# Altium footprint library alex_footprint.PcbLib: 262 footprints (part 12 of 17)
Each footprint in its own frame and in the unit in brackets; x right, y up, seen from the top. Pads: shape width x height; smd on the part's side, far side on the other; paste and mask are expansions set on the pad; w line width, h text height; cw(c..) or ccw(c..) is an arc to the next point about the centre after c.
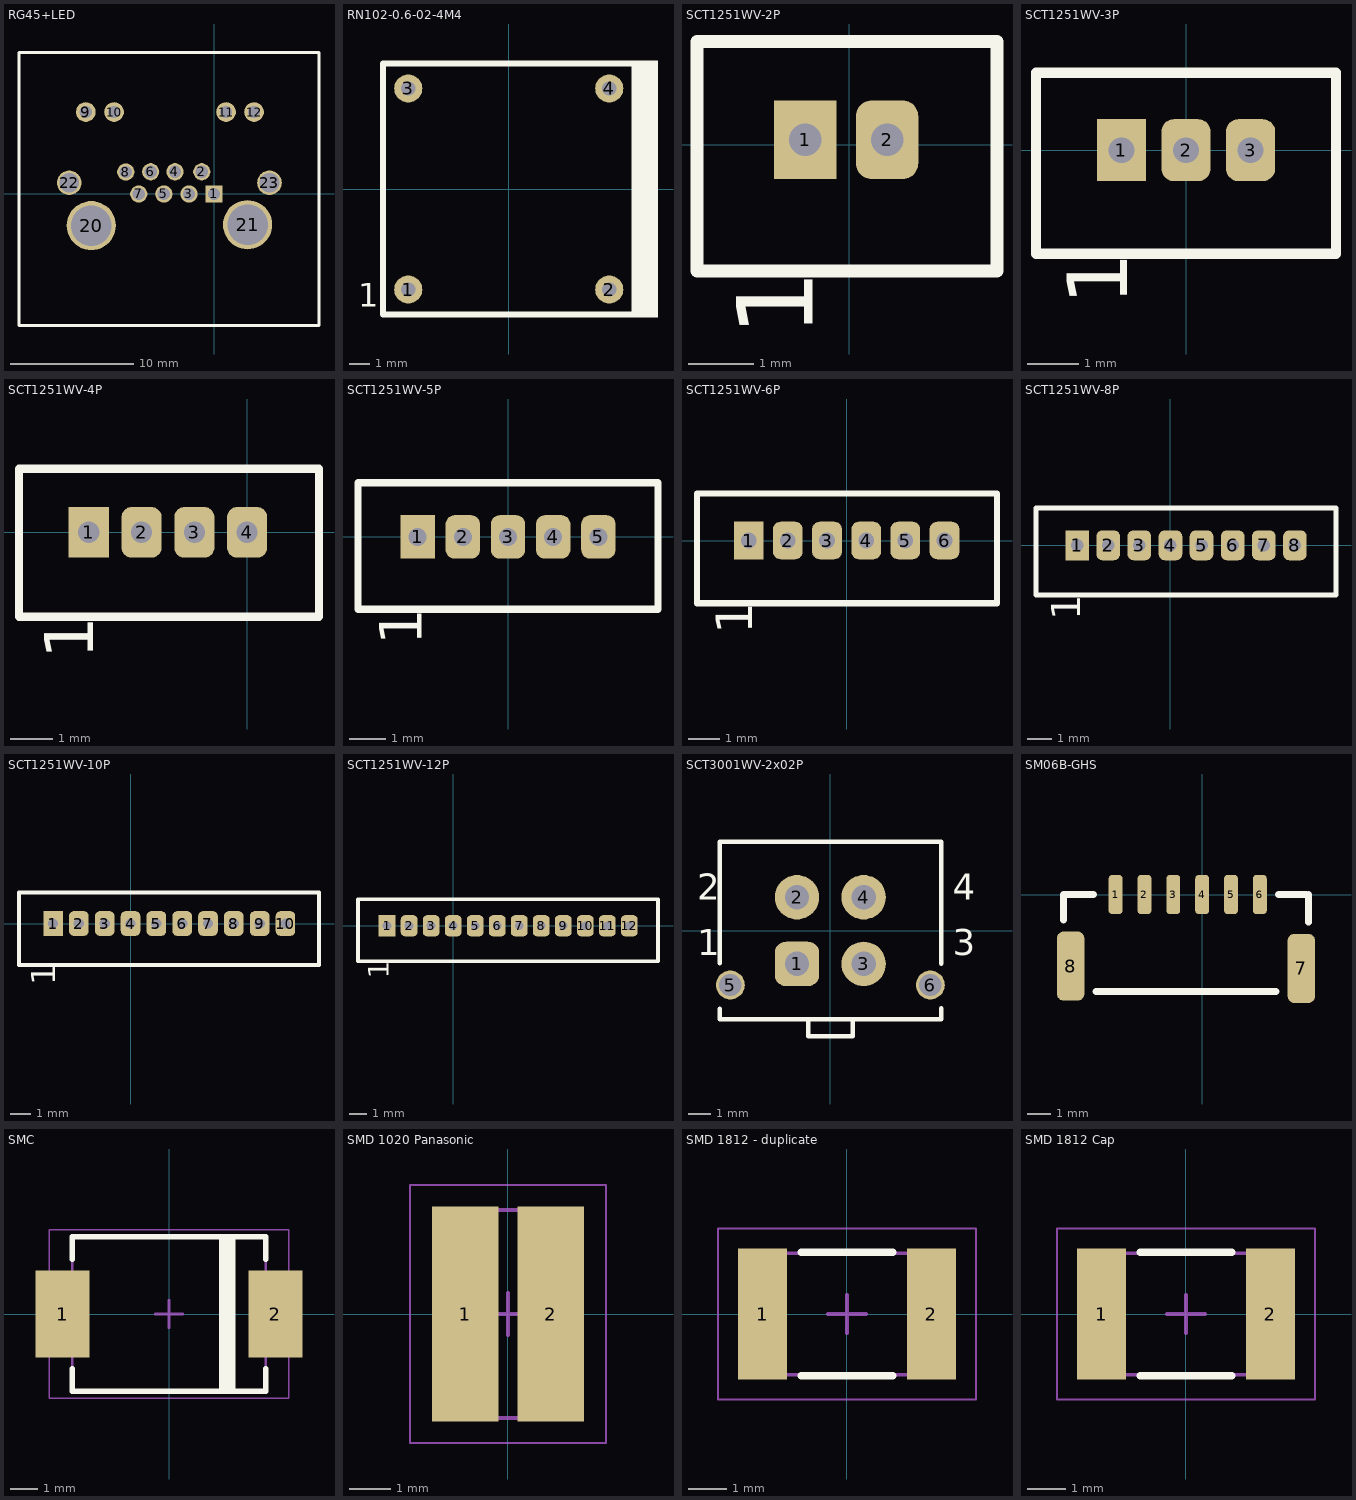
[diagram p11: the footprints below, top view; thin cyan lines are the x and y axes]

## RG45+LED [mm]
height 20
pads (16):
  rect 1.4x1.4 hole 1 unplated: 1(0,0)
  round 1.4 hole 1 unplated: 2(-1,1.8) 3(-2.04,0) 4(-3.177,1.8) 5(-4.08,0) 6(-5.15,1.8) 7(-6.12,0) 8(-7.175,1.775)
  round 1.6 hole 1 unplated: 9(-10.425,6.65) 10(-8.125,6.65) 11(0.975,6.65) 12(3.25,6.65)
  round 4 hole 3.3 unplated: 20(-9.975,-2.575) 21(2.725,-2.5)
  round 2 hole 1.6 unplated: 22(-11.775,0.9) 23(4.5,0.9)
Top Overlay:
  lines w0.254: -15.85,-10.7 -15.85,11.5 8.525,11.5 8.525,-10.7 -15.8,-10.7 -15.85,-10.65

## RN102-0.6-02-4M4 [mm]
pads (4):
  round 1.4 hole 0.7 unplated mask+0.2: 1(-5,-5) 2(5,-5) 3(-5,5) 4(5,5)
Top Overlay:
  rectangle: 6.25,-6.4 7.425,6.4
  lines w0.3: -6.25,-6.25 -6.25,6.25 6.25,6.25 6.25,-6.25 -6.25,-6.25
  text "1" at -7.5,-6.25 h2

## SCT1251WV-2P [mm]
pads (2):
  rect 0.95x1.2 hole 0.5 unplated mask+0.25: 1(-0.675,0.075)
  rrect50% 0.95x1.2 hole 0.5 unplated mask+0.25: 2(0.575,0.075)
Top Overlay:
  lines w0.2: -2.325,-1.925 2.25,-1.925 2.25,-1.05 2.25,0.7 2.25,1.575 -2.325,1.575 -2.325,-1.925
  text "1" at -0.175,-2.925 h2
3D body "530470210.stp": height 4.2, standoff -2.3, extent -2.15,-1.925 2.1,1.275

## SCT1251WV-3P [mm]
pads (3):
  rect 0.95x1.2 hole 0.5 unplated mask+0.25: 1(-1.25,0)
  rrect50% 0.95x1.2 hole 0.5 unplated mask+0.25: 2(0,0) 3(1.25,0)
Top Overlay:
  lines w0.2: -2.9,-2 -2.9,1.5 2.9,1.5 2.9,-2 -2.9,-2
  text "1" at -0.75,-3 h2
3D body "530470310.stp": height 4.2, standoff -2.3, extent -2.775,-2.025 2.725,1.175

## SCT1251WV-4P [mm]
pads (4):
  rect 0.95x1.2 hole 0.5 unplated mask+0.25: 1(-3.75,0)
  rrect50% 0.95x1.2 hole 0.5 unplated mask+0.25: 2(-2.5,0) 3(-1.25,0) 4(0,0)
Top Overlay:
  lines w0.2: -5.4,-2 1,-2 1.7,-2 1.7,1.5 -5.4,1.5 -5.4,-2
  text "1" at -3.25,-3 h2

## SCT1251WV-5P [mm]
pads (5):
  rect 0.95x1.2 hole 0.5 unplated mask+0.25: 1(-2.5,0)
  rrect50% 0.95x1.2 hole 0.5 unplated mask+0.25: 2(-1.25,0) 3(0,0) 4(1.25,0) 5(2.5,0)
Top Overlay:
  lines w0.2: -4.15,-2 -4.15,1.5 4.15,1.5 4.15,-2 2.25,-2 -4.15,-2
  text "1" at -2,-3 h2
3D body "530470510.stp": height 4.2, standoff -2.3, extent -4,-2.075 4,1.125

## SCT1251WV-6P [mm]
pads (6):
  rect 0.95x1.2 hole 0.5 unplated mask+0.25: 1(-3.125,0)
  rrect50% 0.95x1.2 hole 0.5 unplated mask+0.25: 2(-1.875,0) 3(-0.625,0) 4(0.625,0) 5(1.875,0) 6(3.125,0)
Top Overlay:
  lines w0.2: -4.775,-2 -4.775,1.5 4.8,1.5 4.8,-2 1.625,-2 -4.775,-2
  text "1" at -2.625,-3 h2
3D body "530470610.stp": height 4.22, standoff -2.28, extent -4.625,-2.05 4.625,1.15

## SCT1251WV-8P [mm]
pads (8):
  rect 0.95x1.2 hole 0.5 unplated mask+0.25: 1(-3.75,0)
  rrect50% 0.95x1.2 hole 0.5 unplated mask+0.25: 2(-2.5,0) 3(-1.25,0) 4(0,0) 5(1.25,0) 6(2.5,0) 7(3.75,0) 8(5,0)
Top Overlay:
  lines w0.2: 6.65,1.475 6.65,-2 1,-2 -5.4,-2 -5.4,1.5 6.65,1.5
  text "1" at -3.25,-3 h2
3D body "530470810.stp": height 4, standoff -2.5, extent -5.25,-2.025 6.5,1.175

## SCT1251WV-10P [mm]
pads (10):
  rect 0.95x1.2 hole 0.5 unplated mask+0.25: 1(-3.75,0)
  rrect50% 0.95x1.2 hole 0.5 unplated mask+0.25: 2(-2.5,0) 3(-1.25,0) 4(0,0) 5(1.25,0) 6(2.5,0) 7(3.75,0) 8(5,0) 9(6.25,0) 10(7.5,0)
Top Overlay:
  lines w0.2: -5.4,-2 -5.4,1.5 9.125,1.5 9.125,-2 1,-2 -5.4,-2
  text "1" at -3.25,-3 h2
3D body "530471010.stp": height 4.1, standoff -2.4, extent -5.285,-2 8.965,1.2

## SCT1251WV-12P [mm]
pads (12):
  rect 0.95x1.2 hole 0.5 unplated mask+0.25: 1(-3.75,0)
  rrect50% 0.95x1.2 hole 0.5 unplated mask+0.25: 2(-2.5,0) 3(-1.25,0) 4(0,0) 5(1.25,0) 6(2.5,0) 7(3.75,0) 8(5,0) 9(6.25,0) 10(7.5,0) 11(8.75,0) 12(10,0)
Top Overlay:
  lines w0.2: -5.4,-2 -5.4,1.5 9.125,1.5 11.625,1.5 11.625,-2 9.125,-2 1,-2 -5.4,-2
  text "1" at -3.25,-3 h2
3D body "530471210.stp": height 4.05, standoff -2.45, extent -5.245,-2.07 11.505,1.13

## SCT3001WV-2x02P [mm]
pads (6):
  rrect50% 2x2 hole 1.1 unplated mask+0.25: 1(-1.5,-1.5)
  round 2 hole 1.1 unplated mask+0.25: 2(-1.5,1.5) 3(1.5,-1.5) 4(1.5,1.5)
  round 1.3 hole 1 unplated mask+0.25: 5(-4.5,-2.45) 6(4.5,-2.45)
Top Overlay:
  lines w0.2: -4.976,-3.524 -4.976,-4 5,-4 5,-3.5 ; -4.976,-1.476 -4.976,-0.976 -4.976,3.992 4.992,3.992 ; -1,-4 -1,-4.75 0,-4.75 1,-4.75 1,-4 ; 4.992,-1.492 4.992,3.992 ; 5,3.984 4.992,3.992
  text "4" at 5.5,1 h2
  text "3" at 5.5,-1.5 h2
  text "2" at -6,1 h2
  text "1" at -6,-1.5 h2

## SM06B-GHS [mm]
pads (8):
  rrect50% 0.6x1.7 smd mask+0.25: 1(-3.75,0) 2(-2.5,0) 3(-1.25,0) 4(0,0) 5(1.25,0) 6(2.5,0)
  rrect50% 1.2x3 smd mask+0.25: 7(4.3,-3.2) 8(-5.7,-3.1)
Top Overlay:
  lines w0.3: -6,-1.1 -6,0 -4.7,0 ; -4.6,-4.2 3.2,-4.2 ; 3.3,0 4.5,0 ; 4.6,-1.2 4.6,-0.9 4.6,-0.3 4.6,0

## SMC [mm] "Molded Capacitor, 2-Leads, Body 7,00x5,60mm, IPC Medium Density"
height 2.62
pads (2):
  rect 1.95x3.15 smd: 1(-3.85,0) 2(3.85,0)
Top Overlay:
  rectangle: 1.9,-2.8 2.3,2.8
  lines w0.2: -3.5,-1.975 -3.5,-2.8 3.5,-2.8 3.5,-1.975 ; -3.5,1.975 -3.5,2.8 3.5,2.8 3.5,1.975 ; 1.9,-2.5 1.9,-1.9 1.9,2.7 ; 1.9,-2 2,-1.9 2,2.6 1.9,2.7 ; 1.9,-2 1.9,-2.8 1.9,2.7 ; 1.9,-2 2.15,-1.75 2.15,1.05 2.3,1.2 2.3,-2.7 ; 1.9,2.7 2.1,2.7 2.1,-2.8 2.2,-2.7 2.2,2.8 2.3,2.7 ; 2.3,-2.7 2.3,2.7 ; 2.3,-2.7 2.3,2.7
Mechanical 13:
  lines w0.1: -3.5,-2.8 -3.5,2.8 3.5,2.8 3.5,-2.8 -3.5,-2.8
Mechanical 15:
  lines w0.05: -4.325,-3.05 -4.325,3.05 4.325,3.05 4.325,-3.05 -4.325,-3.05
  lines w0.1: -0.5,0 0.5,0 ; 0,-0.5 0,0.5
3D body: height 2.62, standoff 0, extent -3.5,-2.8 3.5,2.8

## SMD 1020 Panasonic [mm]
height 0.6
pads (2):
  rect 1.6x5.15 smd: 1(-1.025,0) 2(1.025,0)
Mechanical 13:
  lines w0.1: -1.25,-2.5 1.25,-2.5 1.25,2.5 -1.25,2.5 -1.25,-2.5
Mechanical 15:
  lines w0.05: -2.35,-3.1 2.35,-3.1 2.35,3.1 -2.35,3.1 -2.35,-3.1
  lines w0.1: -0.5,0 0.5,0 ; 0,-0.5 0,0.5
3D body: height 0.6, standoff 0, extent 0.25,-2.5 1.25,2.5
3D body: height 0.6, standoff 0, extent -1.25,-2.5 -0.25,2.5
3D body: height 0.6, standoff 0, extent -0.25,-2.5 0.25,2.5

## SMD 1812 - duplicate [mm]
height 1.7
pads (2):
  rect 1.3x3.45 smd: 1(-2.225,0) 2(2.225,0)
Top Overlay:
  lines w0.2: -1.2,-1.625 1.2,-1.625 ; -1.2,1.625 1.2,1.625
Mechanical 13:
  lines w0.1: -2.25,-1.6 -2.25,1.6 2.25,1.6 2.25,-1.6 -2.25,-1.6
Mechanical 15:
  lines w0.05: -3.4,-2.25 -3.4,2.25 3.4,2.25 3.4,-2.25 -3.4,-2.25
  lines w0.1: -0.5,0 0.5,0 ; 0,-0.5 0,0.5
3D body: height 1.7, standoff 0, extent -1.65,-1.6 1.65,1.6
3D body: height 1.7, standoff 0, extent -2.25,-1.6 -1.65,1.6
3D body: height 1.7, standoff 0, extent 1.65,-1.6 2.25,1.6

## SMD 1812 Cap [mm]
height 1.7
pads (2):
  rect 1.3x3.45 smd: 1(-2.225,0) 2(2.225,0)
Top Overlay:
  lines w0.2: -1.2,-1.625 1.2,-1.625 ; -1.2,1.625 1.2,1.625
Mechanical 13:
  lines w0.1: -2.25,-1.6 -2.25,1.6 2.25,1.6 2.25,-1.6 -2.25,-1.6
Mechanical 15:
  lines w0.05: -3.4,-2.25 -3.4,2.25 3.4,2.25 3.4,-2.25 -3.4,-2.25
  lines w0.1: -0.5,0 0.5,0 ; 0,-0.5 0,0.5
3D body: height 1.7, standoff 0, extent -1.65,-1.6 1.65,1.6
3D body: height 1.7, standoff 0, extent -2.25,-1.6 -1.65,1.6
3D body: height 1.7, standoff 0, extent 1.65,-1.6 2.25,1.6